# Altium footprint library SBCLib.PcbLib: 120 footprints (part 8 of 8)
Each footprint in its own frame and in the unit in brackets; x right, y up, seen from the top. Pads: shape width x height; smd on the part's side, far side on the other; paste and mask are expansions set on the pad; w line width, h text height; cw(c..) or ccw(c..) is an arc to the next point about the centre after c.
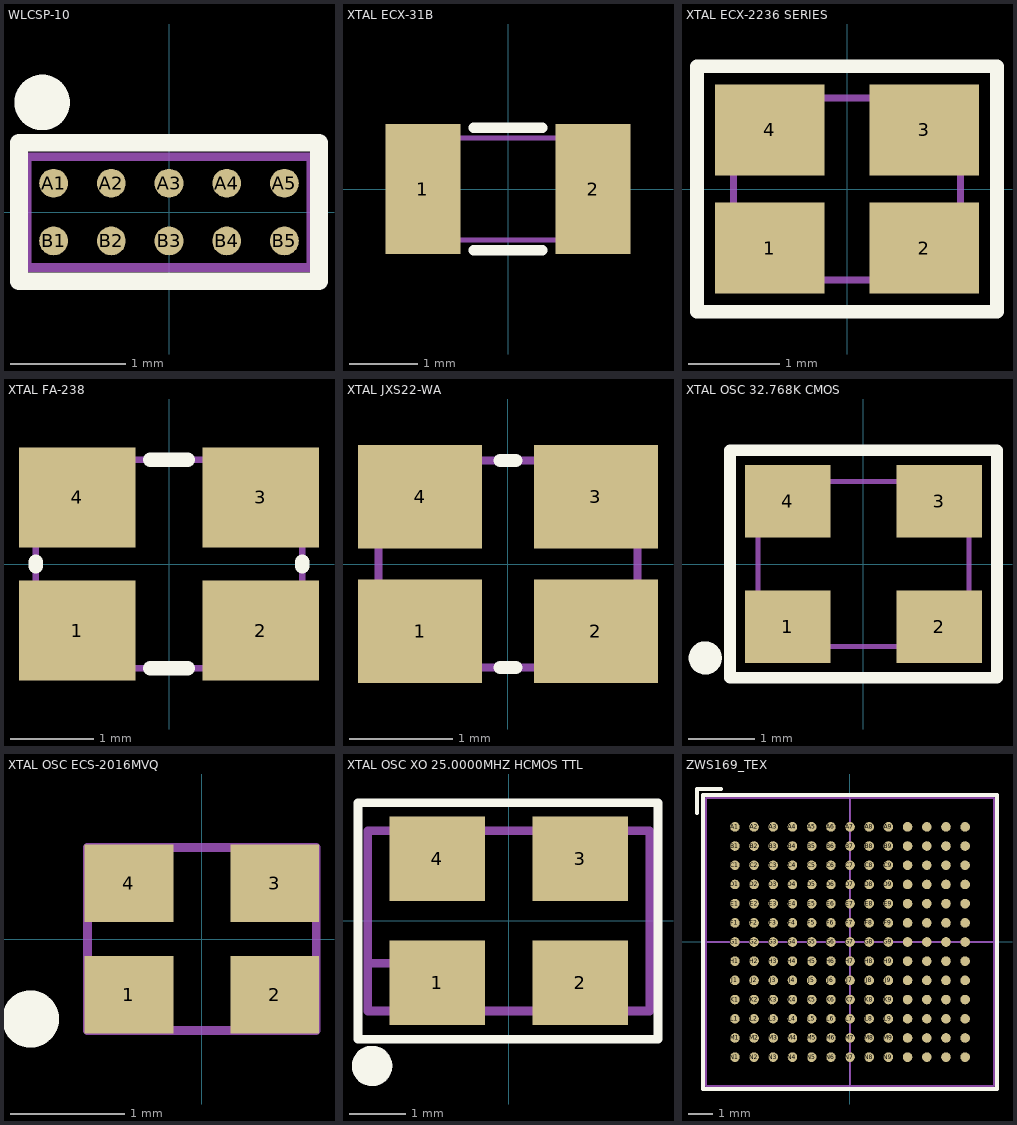
[diagram p7: the footprints below, top view; thin cyan lines are the x and y axes]

## WLCSP-10 [mm]
pads (10):
  round 0.25 smd paste+0: A1(-1,0.25) A2(-0.5,0.25) A3(0,0.25) A4(0.5,0.25) A5(1,0.25) B1(-1,-0.25) B2(-0.5,-0.25) B3(0,-0.25) B4(0.5,-0.25) B5(1,-0.25)
Top Overlay:
  circle w0.381: c-1.1,0.95 r0.05
  lines w0.152: -1.3,-0.6 -1.3,0.6 1.3,0.6 1.3,-0.6 -1.3,-0.6
Mechanical 3:
  lines w0.076: -1.23,-0.48 1.23,-0.48 1.23,0.48 -1.23,0.48 -1.23,-0.48
3D body: height 0.34, standoff 0, extent 0.839,-0.412 1.17,-0.088
3D body: height 0.34, standoff 0, extent 0.838,0.088 1.17,0.412
3D body: height 0.34, standoff 0, extent 0.339,0.088 0.67,0.412
3D body: height 0.34, standoff 0, extent 0.339,-0.412 0.67,-0.088
3D body: height 0.34, standoff 0, extent -0.162,-0.412 0.17,-0.088
3D body: height 0.34, standoff 0, extent -0.162,0.088 0.17,0.412
3D body: height 0.34, standoff 0, extent -0.661,0.088 -0.33,0.412
3D body: height 0.34, standoff 0, extent -0.661,-0.412 -0.33,-0.088
3D body: height 0.34, standoff 0, extent -1.162,-0.412 -0.83,-0.088
3D body: height 0.34, standoff 0, extent -1.166,0.088 -0.834,0.412
3D body: height 0.65, standoff 0.21, extent -1.23,-0.48 1.23,0.48

## XTAL ECX-31B [mm]
pads (2):
  rect 1.1x1.9 smd: 1(-1.25,0) 2(1.25,0)
Top Overlay:
  lines w0.152: -0.5,-0.9 0.5,-0.9 ; -0.5,0.9 0.5,0.9
Mechanical 3:
  lines w0.076: -1.6,-0.75 1.6,-0.75 1.6,0.75 -1.6,0.75 -1.6,-0.75
3D body "ECS-.327-12.5-34B-C-TR--3DModel-STEP-40055.STEP": height 0.9, standoff 0, extent -1.6,-0.75 1.6,0.75

## XTAL ECX-2236 SERIES [mm]
pads (4):
  rect 1.2x1 smd: 1(-0.85,-0.65) 2(0.85,-0.65) 3(0.85,0.65) 4(-0.85,0.65)
Top Overlay:
  lines w0.152: -1.65,-1.35 -1.65,1.35 1.65,1.35 1.65,-1.3 1.65,-1.35 -1.65,-1.35
Mechanical 3:
  lines w0.076: -1.25,-1 1.25,-1 1.25,1 -1.25,1 -1.25,-1
3D body "ECS-320-8-36-RWN-TR.STEP": height 0.5, standoff 0, extent -1.25,-1 1.25,1

## XTAL FA-238 [mm]
pads (4):
  rect 1.4x1.2 smd: 1(-1.1,-0.8) 2(1.1,-0.8) 3(1.1,0.8) 4(-1.1,0.8)
Top Overlay:
  lines w0.178: -1.6,-0.025 -1.6,0.025 ; -0.225,-1.25 0.225,-1.25 ; -0.225,1.25 0.225,1.25 ; 1.6,-0.025 1.6,0.025
Mechanical 3:
  lines w0.076: -1.6,-1.25 -1.6,1.25 1.6,1.25 1.6,-1.25 -1.6,-1.25
3D body "FA-238--3DModel-STEP-56544.STEP": height 0.7, standoff 0, extent -1.6,-1.25 1.6,1.25

## XTAL JXS22-WA [mm]
pads (4):
  rect 1.2x1 smd: 1(-0.85,-0.65) 2(0.85,-0.65) 3(0.85,0.65) 4(-0.85,0.65)
Top Overlay:
  lines w0.127: -0.075,-1 0.075,-1 ; -0.075,1 0.075,1
Mechanical 3:
  lines w0.076: -1.25,-1 1.25,-1 1.25,1 -1.25,1 -1.25,-1
3D body: height 0.55, standoff 0, extent -1.25,-1 1.25,1

## XTAL OSC 32.768K CMOS [mm]
pads (4):
  rect 1.3x1.1 smd: 1(-1.15,-0.95) 2(1.15,-0.95) 3(1.15,0.95) 4(-1.15,0.95)
Top Overlay:
  circle w0.254: c-2.4,-1.425 r0.125
  lines w0.178: -2.025,-1.725 -2.025,1.725 2.025,1.725 2.025,-1.725 -2.025,-1.725
Mechanical 3:
  lines w0.076: -1.6,-1.25 1.6,-1.25 1.6,1.25 -1.6,1.25 -1.6,-1.25
3D body: height 1.05, standoff 0, extent -1.6,-1.25 1.6,1.25

## XTAL OSC ECS-2016MVQ [mm]
pads (4):
  rect 0.775x0.675 smd: 1(-0.638,-0.487) 2(0.638,-0.487) 3(0.638,0.487) 4(-0.638,0.487)
Top Overlay:
  circle w0.3: c-1.5,-0.7 r0.1
Mechanical 3:
  circle w0.2: c-0.7,-0.5 r0.1
  lines w0.076: -1,-0.8 1,-0.8 1,0.8 -1,0.8 -1,-0.8
3D body "ECS-2016MVQ-250-CN-TR.STEP": height 0.9, standoff 0, extent -1,-0.8 1,0.8

## XTAL OSC XO 25.0000MHZ HCMOS TTL [mm] "ASFL1-25.000MHZ-EC-T"
pads (4):
  rect 1.7x1.5 smd: 1(-1.27,-1.1) 2(1.27,-1.1) 3(1.27,1.1) 4(-1.27,1.1)
Top Overlay:
  circle w0.381: c-2.425,-2.575 r0.168
  lines w0.152: -2.675,-2.1 -2.675,2.1 2.65,2.1 2.65,-2.1 -2.675,-2.1
Mechanical 3:
  lines w0.152: -2.5,-1.6 2.5,-1.6 2.5,1.6 -2.5,1.6 -2.5,-1.6 ; -2.5,-1.6 -2.5,-0.75 -1.65,-0.75 -1.65,-1.6 -2.5,-1.6
3D body "ASFL1.STEP": height 1.32, standoff 0.02, extent -2.5,-1.6 2.5,1.6

## ZWS169_TEX [mm]
pads (169):
  round 0.4 smd paste+0 mask+0.04: A1(-4.8,4.8) A2(-4,4.8) A3(-3.2,4.8) A4(-2.4,4.8) A5(-1.6,4.8) A6(-0.8,4.8) A7(0,4.8) A8(0.8,4.8) A9(1.6,4.8) A10(2.4,4.8) A11(3.2,4.8) A12(4,4.8) A13(4.8,4.8) B1(-4.8,4) B2(-4,4) B3(-3.2,4) B4(-2.4,4) B5(-1.6,4) B6(-0.8,4) B7(0,4) B8(0.8,4) B9(1.6,4) B10(2.4,4) B11(3.2,4) B12(4,4) B13(4.8,4) C1(-4.8,3.2) C2(-4,3.2) C3(-3.2,3.2) C4(-2.4,3.2) C5(-1.6,3.2) C6(-0.8,3.2) C7(0,3.2) C8(0.8,3.2) C9(1.6,3.2) C10(2.4,3.2) C11(3.2,3.2) C12(4,3.2) C13(4.8,3.2) D1(-4.8,2.4) D2(-4,2.4) D3(-3.2,2.4) D4(-2.4,2.4) D5(-1.6,2.4) D6(-0.8,2.4) D7(0,2.4) D8(0.8,2.4) D9(1.6,2.4) D10(2.4,2.4) D11(3.2,2.4) D12(4,2.4) D13(4.8,2.4) E1(-4.8,1.6) E2(-4,1.6) E3(-3.2,1.6) E4(-2.4,1.6) E5(-1.6,1.6) E6(-0.8,1.6) E7(0,1.6) E8(0.8,1.6) E9(1.6,1.6) E10(2.4,1.6) E11(3.2,1.6) E12(4,1.6) E13(4.8,1.6) F1(-4.8,0.8) F2(-4,0.8) F3(-3.2,0.8) F4(-2.4,0.8) F5(-1.6,0.8) F6(-0.8,0.8) F7(0,0.8) F8(0.8,0.8) F9(1.6,0.8) F10(2.4,0.8) F11(3.2,0.8) F12(4,0.8) F13(4.8,0.8) G1(-4.8,0) G2(-4,0) G3(-3.2,0) G4(-2.4,0) G5(-1.6,0) G6(-0.8,0) G7(0,0) G8(0.8,0) G9(1.6,0) G10(2.4,0) G11(3.2,0) G12(4,0) G13(4.8,0) H1(-4.8,-0.8) H2(-4,-0.8) H3(-3.2,-0.8) H4(-2.4,-0.8) H5(-1.6,-0.8) H6(-0.8,-0.8) H7(0,-0.8) H8(0.8,-0.8) H9(1.6,-0.8) H10(2.4,-0.8) H11(3.2,-0.8) H12(4,-0.8) H13(4.8,-0.8) J1(-4.8,-1.6) J2(-4,-1.6) J3(-3.2,-1.6) J4(-2.4,-1.6) J5(-1.6,-1.6) J6(-0.8,-1.6) J7(0,-1.6) J8(0.8,-1.6) J9(1.6,-1.6) J10(2.4,-1.6) J11(3.2,-1.6) J12(4,-1.6) J13(4.8,-1.6) K1(-4.8,-2.4) K2(-4,-2.4) K3(-3.2,-2.4) K4(-2.4,-2.4) K5(-1.6,-2.4) K6(-0.8,-2.4) K7(0,-2.4) K8(0.8,-2.4) K9(1.6,-2.4) K10(2.4,-2.4) K11(3.2,-2.4) K12(4,-2.4) K13(4.8,-2.4) L1(-4.8,-3.2) L2(-4,-3.2) L3(-3.2,-3.2) L4(-2.4,-3.2) L5(-1.6,-3.2) L6(-0.8,-3.2) L7(0,-3.2) L8(0.8,-3.2) L9(1.6,-3.2) L10(2.4,-3.2) L11(3.2,-3.2) L12(4,-3.2) L13(4.8,-3.2) M1(-4.8,-4) M2(-4,-4) M3(-3.2,-4) M4(-2.4,-4) M5(-1.6,-4) M6(-0.8,-4) M7(0,-4) M8(0.8,-4) M9(1.6,-4) M10(2.4,-4) M11(3.2,-4) M12(4,-4) M13(4.8,-4) N1(-4.8,-4.8) N2(-4,-4.8) N3(-3.2,-4.8) N4(-2.4,-4.8) N5(-1.6,-4.8) N6(-0.8,-4.8) N7(0,-4.8) N8(0.8,-4.8) N9(1.6,-4.8) N10(2.4,-4.8) N11(3.2,-4.8) N12(4,-4.8) N13(4.8,-4.8)
Top Overlay:
  lines w0.178: -6.377,5.377 -6.377,6.377 -5.377,6.377 ; -6.127,-6.127 6.127,-6.127 6.127,6.127 -6.127,6.127 -6.127,-6.127
Mechanical 3:
  lines w0.076: -6,0 6,0 ; 0,-6 0,6 ; -6,-6 -6,6 6,6 6,-6 -6,-6
  text "N" at -7.27,-5.435 h1.27
  text "A" at -7.27,4.165 h1.27
  text "1" at -4.165,6.635 h1.27
  text "13" at 5.435,6.635 h1.27
3D body "ZWS169_TEX.step": height 1.4, standoff 0, extent -6,-6 6,6